# Altium schematic symbol library jlcpcb_2025_04_inductors_extended_0805.schlib: 882 symbols (part 2 of 5) (continued)
## FCI2012F-R12K
designator L?  Inductance: 120nH
Inductor, 120nH, ±10%, 300mΩ, 250mA, SMD 0805; Manufacturer: TAI-TECH; Manufacturer Part Number: FCI2012F-R12K; Package Size: 0805; JLCPCB Basic Part: No; JLCPCB Part Number: C155025; Supplier 1: LCSC; Category: Inductors; Supplier Part Number 1: C155025; Tolerance: ±10%; Rated Current: 250mA; DC Resistance: 300mΩ; RoHS: Yes; ComponentLink1Description: Datasheet; ComponentLink1URL: https://wmsc.lcsc.com/wmsc/upload/file/pdf/v2/lcsc/2009171305_TAI-TECH-FCI2012F-R12K_C155025.pdf; ComponentLink2Description: JLCPCB Part URL; ComponentLink2URL: https://jlcpcb.com/partdetail/C155025; ComponentLink3Description: LCSC Part URL; ComponentLink3URL: https://lcsc.com/product-detail/Inductors-SMD_TAI-TECH-TAI-TECH-FCI2012F-R12K_C155025.html
footprint IND-0805 (0805 (2012M) Inductor)
pins: 1, 2

## FCI2012F-R15K
designator L?  Inductance: 150nH
Inductor, 150nH, ±10%, 400mΩ, 250mA, SMD 0805; Manufacturer: TAI-TECH; Manufacturer Part Number: FCI2012F-R15K; Package Size: 0805; JLCPCB Basic Part: No; JLCPCB Part Number: C155026; Supplier 1: LCSC; Category: Inductors; Supplier Part Number 1: C155026; Tolerance: ±10%; Rated Current: 250mA; DC Resistance: 400mΩ; RoHS: Yes; ComponentLink1Description: Datasheet; ComponentLink1URL: https://wmsc.lcsc.com/wmsc/upload/file/pdf/v2/lcsc/2009171305_TAI-TECH-FCI2012F-R15K_C155026.pdf; ComponentLink2Description: JLCPCB Part URL; ComponentLink2URL: https://jlcpcb.com/partdetail/C155026; ComponentLink3Description: LCSC Part URL; ComponentLink3URL: https://lcsc.com/product-detail/Inductors-SMD_TAI-TECH-TAI-TECH-FCI2012F-R15K_C155026.html
footprint IND-0805 (0805 (2012M) Inductor)
pins: 1, 2

## FCI2012F-R18K
designator L?  Inductance: 180nH
Inductor, 180nH, ±10%, 400mΩ, 250mA, SMD 0805; Manufacturer: TAI-TECH; Manufacturer Part Number: FCI2012F-R18K; Package Size: 0805; JLCPCB Basic Part: No; JLCPCB Part Number: C155027; Supplier 1: LCSC; Category: Inductors; Supplier Part Number 1: C155027; Tolerance: ±10%; Rated Current: 250mA; DC Resistance: 400mΩ; RoHS: Yes; ComponentLink1Description: Datasheet; ComponentLink1URL: https://wmsc.lcsc.com/wmsc/upload/file/pdf/v2/lcsc/2009171305_TAI-TECH-FCI2012F-R18K_C155027.pdf; ComponentLink2Description: JLCPCB Part URL; ComponentLink2URL: https://jlcpcb.com/partdetail/C155027; ComponentLink3Description: LCSC Part URL; ComponentLink3URL: https://lcsc.com/product-detail/Inductors-SMD_TAI-TECH-TAI-TECH-FCI2012F-R18K_C155027.html
footprint IND-0805 (0805 (2012M) Inductor)
pins: 1, 2

## FCI2012F-R22K
designator L?  Inductance: 220nH
Inductor, 220nH, ±10%, 500mΩ, 250mA, SMD 0805; Manufacturer: TAI-TECH; Manufacturer Part Number: FCI2012F-R22K; Package Size: 0805; JLCPCB Basic Part: No; JLCPCB Part Number: C155028; Supplier 1: LCSC; Category: Inductors; Supplier Part Number 1: C155028; Tolerance: ±10%; Rated Current: 250mA; DC Resistance: 500mΩ; RoHS: Yes; ComponentLink1Description: Datasheet; ComponentLink1URL: https://wmsc.lcsc.com/wmsc/upload/file/pdf/v2/lcsc/2009171305_TAI-TECH-FCI2012F-R22K_C155028.pdf; ComponentLink2Description: JLCPCB Part URL; ComponentLink2URL: https://jlcpcb.com/partdetail/C155028; ComponentLink3Description: LCSC Part URL; ComponentLink3URL: https://lcsc.com/product-detail/Inductors-SMD_TAI-TECH-TAI-TECH-FCI2012F-R22K_C155028.html
footprint IND-0805 (0805 (2012M) Inductor)
pins: 1, 2

## FCI2012F-R27K
designator L?  Inductance: 270nH
Inductor, 270nH, ±10%, 500mΩ, 250mA, SMD 0805; Manufacturer: TAI-TECH; Manufacturer Part Number: FCI2012F-R27K; Package Size: 0805; JLCPCB Basic Part: No; JLCPCB Part Number: C155029; Supplier 1: LCSC; Category: Inductors; Supplier Part Number 1: C155029; Tolerance: ±10%; Rated Current: 250mA; DC Resistance: 500mΩ; RoHS: Yes; ComponentLink1Description: Datasheet; ComponentLink1URL: https://wmsc.lcsc.com/wmsc/upload/file/pdf/v2/lcsc/2009171305_TAI-TECH-FCI2012F-R27K_C155029.pdf; ComponentLink2Description: JLCPCB Part URL; ComponentLink2URL: https://jlcpcb.com/partdetail/C155029; ComponentLink3Description: LCSC Part URL; ComponentLink3URL: https://lcsc.com/product-detail/Inductors-SMD_TAI-TECH-TAI-TECH-FCI2012F-R27K_C155029.html
footprint IND-0805 (0805 (2012M) Inductor)
pins: 1, 2

## FCI2012F-R33K
designator L?  Inductance: 330nH
Inductor, 330nH, ±10%, 550mΩ, 250mA, SMD 0805; Manufacturer: TAI-TECH; Manufacturer Part Number: FCI2012F-R33K; Package Size: 0805; JLCPCB Basic Part: No; JLCPCB Part Number: C155030; Supplier 1: LCSC; Category: Inductors; Supplier Part Number 1: C155030; Tolerance: ±10%; Rated Current: 250mA; DC Resistance: 550mΩ; RoHS: Yes; ComponentLink1Description: Datasheet; ComponentLink1URL: https://wmsc.lcsc.com/wmsc/upload/file/pdf/v2/lcsc/2009171305_TAI-TECH-FCI2012F-R33K_C155030.pdf; ComponentLink2Description: JLCPCB Part URL; ComponentLink2URL: https://jlcpcb.com/partdetail/C155030; ComponentLink3Description: LCSC Part URL; ComponentLink3URL: https://lcsc.com/product-detail/Inductors-SMD_TAI-TECH-TAI-TECH-FCI2012F-R33K_C155030.html
footprint IND-0805 (0805 (2012M) Inductor)
pins: 1, 2

## FCI2012F-R39K
designator L?  Inductance: 390nH
Inductor, 390nH, ±10%, 650mΩ, 200mA, SMD 0805; Manufacturer: TAI-TECH; Manufacturer Part Number: FCI2012F-R39K; Package Size: 0805; JLCPCB Basic Part: No; JLCPCB Part Number: C155031; Supplier 1: LCSC; Category: Inductors; Supplier Part Number 1: C155031; Tolerance: ±10%; Rated Current: 200mA; DC Resistance: 650mΩ; RoHS: Yes; ComponentLink1Description: Datasheet; ComponentLink1URL: https://wmsc.lcsc.com/wmsc/upload/file/pdf/v2/lcsc/2009171305_TAI-TECH-FCI2012F-R39K_C155031.pdf; ComponentLink2Description: JLCPCB Part URL; ComponentLink2URL: https://jlcpcb.com/partdetail/C155031; ComponentLink3Description: LCSC Part URL; ComponentLink3URL: https://lcsc.com/product-detail/Inductors-SMD_TAI-TECH-TAI-TECH-FCI2012F-R39K_C155031.html
footprint IND-0805 (0805 (2012M) Inductor)
pins: 1, 2

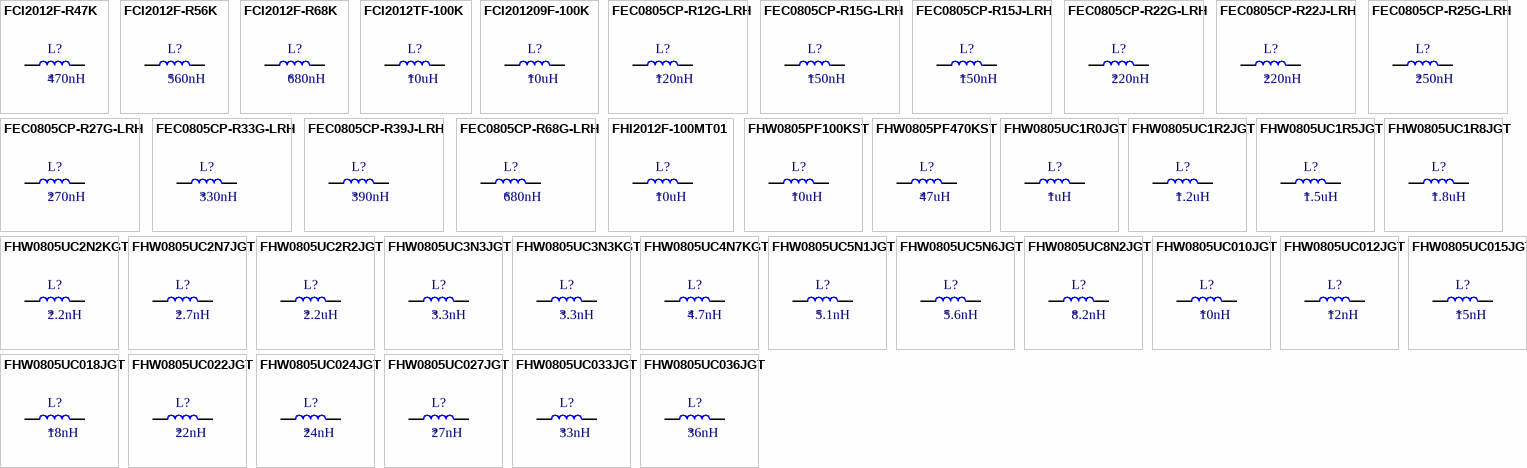
[diagram p6: symbols FCI2012F-R47K to FHW0805UC036JGT]

## FCI2012F-R47K
designator L?  Inductance: 470nH
Inductor, 470nH, ±10%, 650mΩ, 200mA, SMD 0805; Manufacturer: TAI-TECH; Manufacturer Part Number: FCI2012F-R47K; Package Size: 0805; JLCPCB Basic Part: No; JLCPCB Part Number: C155032; Supplier 1: LCSC; Category: Inductors; Supplier Part Number 1: C155032; Tolerance: ±10%; Rated Current: 200mA; DC Resistance: 650mΩ; RoHS: Yes; ComponentLink1Description: Datasheet; ComponentLink1URL: https://wmsc.lcsc.com/wmsc/upload/file/pdf/v2/lcsc/2009171305_TAI-TECH-FCI2012F-R47K_C155032.pdf; ComponentLink2Description: JLCPCB Part URL; ComponentLink2URL: https://jlcpcb.com/partdetail/C155032; ComponentLink3Description: LCSC Part URL; ComponentLink3URL: https://lcsc.com/product-detail/Inductors-SMD_TAI-TECH-TAI-TECH-FCI2012F-R47K_C155032.html
footprint IND-0805 (0805 (2012M) Inductor)
pins: 1, 2

## FCI2012F-R56K
designator L?  Inductance: 560nH
Inductor, 560nH, ±10%, 750mΩ, 150mA, SMD 0805; Manufacturer: TAI-TECH; Manufacturer Part Number: FCI2012F-R56K; Package Size: 0805; JLCPCB Basic Part: No; JLCPCB Part Number: C155033; Supplier 1: LCSC; Category: Inductors; Supplier Part Number 1: C155033; Tolerance: ±10%; Rated Current: 150mA; DC Resistance: 750mΩ; RoHS: Yes; ComponentLink1Description: Datasheet; ComponentLink1URL: https://wmsc.lcsc.com/wmsc/upload/file/pdf/v2/lcsc/2009171305_TAI-TECH-FCI2012F-R56K_C155033.pdf; ComponentLink2Description: JLCPCB Part URL; ComponentLink2URL: https://jlcpcb.com/partdetail/C155033; ComponentLink3Description: LCSC Part URL; ComponentLink3URL: https://lcsc.com/product-detail/Inductors-SMD_TAI-TECH-TAI-TECH-FCI2012F-R56K_C155033.html
footprint IND-0805 (0805 (2012M) Inductor)
pins: 1, 2

## FCI2012F-R68K
designator L?  Inductance: 680nH
Inductor, 680nH, ±10%, 800mΩ, 150mA, SMD 0805; Manufacturer: TAI-TECH; Manufacturer Part Number: FCI2012F-R68K; Package Size: 0805; JLCPCB Basic Part: No; JLCPCB Part Number: C155034; Supplier 1: LCSC; Category: Inductors; Supplier Part Number 1: C155034; Tolerance: ±10%; Rated Current: 150mA; DC Resistance: 800mΩ; RoHS: Yes; ComponentLink1Description: Datasheet; ComponentLink1URL: https://wmsc.lcsc.com/wmsc/upload/file/pdf/v2/lcsc/2009171305_TAI-TECH-FCI2012F-R68K_C155034.pdf; ComponentLink2Description: JLCPCB Part URL; ComponentLink2URL: https://jlcpcb.com/partdetail/C155034; ComponentLink3Description: LCSC Part URL; ComponentLink3URL: https://lcsc.com/product-detail/Inductors-SMD_TAI-TECH-TAI-TECH-FCI2012F-R68K_C155034.html
footprint IND-0805 (0805 (2012M) Inductor)
pins: 1, 2

## FCI2012TF-100K
designator L?  Inductance: 10uH
Inductor, 10uH, ±10%, 1.15Ω, 15mA, SMD 0805; Manufacturer: TAI-TECH; Manufacturer Part Number: FCI2012TF-100K; Package Size: 0805; JLCPCB Basic Part: No; JLCPCB Part Number: C356925; Supplier 1: LCSC; Category: Inductors; Supplier Part Number 1: C356925; Tolerance: ±10%; Rated Current: 15mA; DC Resistance: 1.15Ω; RoHS: Yes; ComponentLink1Description: Datasheet; ComponentLink1URL: https://wmsc.lcsc.com/wmsc/upload/file/pdf/v2/lcsc/2009171137_TAI-TECH-FCI2012TF-100K_C356925.pdf; ComponentLink2Description: JLCPCB Part URL; ComponentLink2URL: https://jlcpcb.com/partdetail/C356925; ComponentLink3Description: LCSC Part URL; ComponentLink3URL: https://lcsc.com/product-detail/Inductors-SMD_TAI-TECH-TAI-TECH-FCI2012TF-100K_C356925.html
footprint IND-0805 (0805 (2012M) Inductor)
pins: 1, 2

## FCI201209F-100K
designator L?  Inductance: 10uH
Inductor, 10uH, ±10%, 1.15Ω, 15mA, SMD 0805; Manufacturer: TAI-TECH; Manufacturer Part Number: FCI201209F-100K; Package Size: 0805; JLCPCB Basic Part: No; JLCPCB Part Number: C304235; Supplier 1: LCSC; Category: Inductors; Supplier Part Number 1: C304235; Tolerance: ±10%; Rated Current: 15mA; DC Resistance: 1.15Ω; RoHS: Yes; ComponentLink1Description: Datasheet; ComponentLink1URL: https://wmsc.lcsc.com/wmsc/upload/file/pdf/v2/lcsc/2009171409_TAI-TECH-FCI201209F-100K_C304235.pdf; ComponentLink2Description: JLCPCB Part URL; ComponentLink2URL: https://jlcpcb.com/partdetail/C304235; ComponentLink3Description: LCSC Part URL; ComponentLink3URL: https://lcsc.com/product-detail/Inductors-SMD_TAI-TECH-TAI-TECH-FCI201209F-100K_C304235.html
footprint IND-0805 (0805 (2012M) Inductor)
pins: 1, 2

## FEC0805CP-R12G-LRH
designator L?  Inductance: 120nH
Inductor, 120nH, ±2%, 510mΩ, 400mA, SMD 0805; Manufacturer: PSA(Prosperity Dielectrics); Manufacturer Part Number: FEC0805CP-R12G-LRH; Package Size: 0805; JLCPCB Basic Part: No; JLCPCB Part Number: C346383; Supplier 1: LCSC; Category: Inductors; Supplier Part Number 1: C346383; Tolerance: ±2%; Rated Current: 400mA; DC Resistance: 510mΩ; RoHS: Yes; ComponentLink1Description: Datasheet; ComponentLink1URL: https://wmsc.lcsc.com/wmsc/upload/file/pdf/v2/lcsc/2304140030_PSA-Prosperity-Dielectrics-FEC0805CP-R12G-LRH_C346383.pdf; ComponentLink2Description: JLCPCB Part URL; ComponentLink2URL: https://jlcpcb.com/partdetail/C346383; ComponentLink3Description: LCSC Part URL; ComponentLink3URL: https://lcsc.com/product-detail/Inductors-SMD_PSAProsperity-Dielectrics-PSAProsperity-Dielectrics-FEC0805CP-R12G-LRH_C346383.html
footprint IND-0805 (0805 (2012M) Inductor)
pins: 1, 2

## FEC0805CP-R15G-LRH
designator L?  Inductance: 150nH
Inductor, 150nH, ±2%, 560mΩ, 400mA, SMD 0805; Manufacturer: PSA(Prosperity Dielectrics); Manufacturer Part Number: FEC0805CP-R15G-LRH; Package Size: 0805; JLCPCB Basic Part: No; JLCPCB Part Number: C346384; Supplier 1: LCSC; Category: Inductors; Supplier Part Number 1: C346384; Tolerance: ±2%; Rated Current: 400mA; DC Resistance: 560mΩ; RoHS: Yes; ComponentLink1Description: Datasheet; ComponentLink1URL: https://wmsc.lcsc.com/wmsc/upload/file/pdf/v2/lcsc/2304140030_PSA-Prosperity-Dielectrics-FEC0805CP-R15G-LRH_C346384.pdf; ComponentLink2Description: JLCPCB Part URL; ComponentLink2URL: https://jlcpcb.com/partdetail/C346384; ComponentLink3Description: LCSC Part URL; ComponentLink3URL: https://lcsc.com/product-detail/Inductors-SMD_PSAProsperity-Dielectrics-PSAProsperity-Dielectrics-FEC0805CP-R15G-LRH_C346384.html
footprint IND-0805 (0805 (2012M) Inductor)
pins: 1, 2

## FEC0805CP-R15J-LRH
designator L?  Inductance: 150nH
Inductor, 150nH, ±5%, 560mΩ, 400mA, SMD 0805; Manufacturer: PSA(Prosperity Dielectrics); Manufacturer Part Number: FEC0805CP-R15J-LRH; Package Size: 0805; JLCPCB Basic Part: No; JLCPCB Part Number: C329441; Supplier 1: LCSC; Category: Inductors; Supplier Part Number 1: C329441; Tolerance: ±5%; Rated Current: 400mA; DC Resistance: 560mΩ; RoHS: Yes; ComponentLink1Description: Datasheet; ComponentLink1URL: https://wmsc.lcsc.com/wmsc/upload/file/pdf/v2/lcsc/2304140030_PSA-Prosperity-Dielectrics-FEC0805CP-R15J-LRH_C329441.pdf; ComponentLink2Description: JLCPCB Part URL; ComponentLink2URL: https://jlcpcb.com/partdetail/C329441; ComponentLink3Description: LCSC Part URL; ComponentLink3URL: https://lcsc.com/product-detail/Inductors-SMD_PSAProsperity-Dielectrics-PSAProsperity-Dielectrics-FEC0805CP-R15J-LRH_C329441.html
footprint IND-0805 (0805 (2012M) Inductor)
pins: 1, 2

## FEC0805CP-R22G-LRH
designator L?  Inductance: 220nH
Inductor, 220nH, ±2%, 700mΩ, 400mA, SMD 0805; Manufacturer: PSA(Prosperity Dielectrics); Manufacturer Part Number: FEC0805CP-R22G-LRH; Package Size: 0805; JLCPCB Basic Part: No; JLCPCB Part Number: C346387; Supplier 1: LCSC; Category: Inductors; Supplier Part Number 1: C346387; Tolerance: ±2%; Rated Current: 400mA; DC Resistance: 700mΩ; RoHS: Yes; ComponentLink1Description: Datasheet; ComponentLink1URL: https://wmsc.lcsc.com/wmsc/upload/file/pdf/v2/lcsc/2304140030_PSA-Prosperity-Dielectrics-FEC0805CP-R22G-LRH_C346387.pdf; ComponentLink2Description: JLCPCB Part URL; ComponentLink2URL: https://jlcpcb.com/partdetail/C346387; ComponentLink3Description: LCSC Part URL; ComponentLink3URL: https://lcsc.com/product-detail/Inductors-SMD_PSAProsperity-Dielectrics-PSAProsperity-Dielectrics-FEC0805CP-R22G-LRH_C346387.html
footprint IND-0805 (0805 (2012M) Inductor)
pins: 1, 2

## FEC0805CP-R22J-LRH
designator L?  Inductance: 220nH
Inductor, 220nH, ±5%, 700mΩ, 400mA, SMD 0805; Manufacturer: PSA(Prosperity Dielectrics); Manufacturer Part Number: FEC0805CP-R22J-LRH; Package Size: 0805; JLCPCB Basic Part: No; JLCPCB Part Number: C329443; Supplier 1: LCSC; Category: Inductors; Supplier Part Number 1: C329443; Tolerance: ±5%; Rated Current: 400mA; DC Resistance: 700mΩ; RoHS: Yes; ComponentLink1Description: Datasheet; ComponentLink1URL: https://wmsc.lcsc.com/wmsc/upload/file/pdf/v2/lcsc/2304140030_PSA-Prosperity-Dielectrics-FEC0805CP-R22J-LRH_C329443.pdf; ComponentLink2Description: JLCPCB Part URL; ComponentLink2URL: https://jlcpcb.com/partdetail/C329443; ComponentLink3Description: LCSC Part URL; ComponentLink3URL: https://lcsc.com/product-detail/Inductors-SMD_PSAProsperity-Dielectrics-PSAProsperity-Dielectrics-FEC0805CP-R22J-LRH_C329443.html
footprint IND-0805 (0805 (2012M) Inductor)
pins: 1, 2

## FEC0805CP-R25G-LRH
designator L?  Inductance: 250nH
Inductor, 250nH, ±2%, 1.2Ω, 350mA, SMD 0805; Manufacturer: PSA(Prosperity Dielectrics); Manufacturer Part Number: FEC0805CP-R25G-LRH; Package Size: 0805; JLCPCB Basic Part: No; JLCPCB Part Number: C346389; Supplier 1: LCSC; Category: Inductors; Supplier Part Number 1: C346389; Tolerance: ±2%; Rated Current: 350mA; DC Resistance: 1.2Ω; RoHS: Yes; ComponentLink1Description: Datasheet; ComponentLink1URL: https://wmsc.lcsc.com/wmsc/upload/file/pdf/v2/lcsc/2304140030_PSA-Prosperity-Dielectrics-FEC0805CP-R25G-LRH_C346389.pdf; ComponentLink2Description: JLCPCB Part URL; ComponentLink2URL: https://jlcpcb.com/partdetail/C346389; ComponentLink3Description: LCSC Part URL; ComponentLink3URL: https://lcsc.com/product-detail/Inductors-SMD_PSAProsperity-Dielectrics-PSAProsperity-Dielectrics-FEC0805CP-R25G-LRH_C346389.html
footprint IND-0805 (0805 (2012M) Inductor)
pins: 1, 2

## FEC0805CP-R27G-LRH
designator L?  Inductance: 270nH
Inductor, 270nH, ±2%, 1Ω, 350mA, SMD 0805; Manufacturer: PSA(Prosperity Dielectrics); Manufacturer Part Number: FEC0805CP-R27G-LRH; Package Size: 0805; JLCPCB Basic Part: No; JLCPCB Part Number: C346390; Supplier 1: LCSC; Category: Inductors; Supplier Part Number 1: C346390; Tolerance: ±2%; Rated Current: 350mA; DC Resistance: 1Ω; RoHS: Yes; ComponentLink1Description: Datasheet; ComponentLink1URL: https://wmsc.lcsc.com/wmsc/upload/file/pdf/v2/lcsc/2304140030_PSA-Prosperity-Dielectrics-FEC0805CP-R27G-LRH_C346390.pdf; ComponentLink2Description: JLCPCB Part URL; ComponentLink2URL: https://jlcpcb.com/partdetail/C346390; ComponentLink3Description: LCSC Part URL; ComponentLink3URL: https://lcsc.com/product-detail/Inductors-SMD_PSAProsperity-Dielectrics-PSAProsperity-Dielectrics-FEC0805CP-R27G-LRH_C346390.html
footprint IND-0805 (0805 (2012M) Inductor)
pins: 1, 2

## FEC0805CP-R33G-LRH
designator L?  Inductance: 330nH
Inductor, 330nH, ±2%, 1.4Ω, 310mA, SMD 0805; Manufacturer: PSA(Prosperity Dielectrics); Manufacturer Part Number: FEC0805CP-R33G-LRH; Package Size: 0805; JLCPCB Basic Part: No; JLCPCB Part Number: C346392; Supplier 1: LCSC; Category: Inductors; Supplier Part Number 1: C346392; Tolerance: ±2%; Rated Current: 310mA; DC Resistance: 1.4Ω; RoHS: Yes; ComponentLink1Description: Datasheet; ComponentLink1URL: https://wmsc.lcsc.com/wmsc/upload/file/pdf/v2/lcsc/2304140030_PSA-Prosperity-Dielectrics-FEC0805CP-R33G-LRH_C346392.pdf; ComponentLink2Description: JLCPCB Part URL; ComponentLink2URL: https://jlcpcb.com/partdetail/C346392; ComponentLink3Description: LCSC Part URL; ComponentLink3URL: https://lcsc.com/product-detail/Inductors-SMD_PSAProsperity-Dielectrics-PSAProsperity-Dielectrics-FEC0805CP-R33G-LRH_C346392.html
footprint IND-0805 (0805 (2012M) Inductor)
pins: 1, 2

## FEC0805CP-R39J-LRH
designator L?  Inductance: 390nH
Inductor, 390nH, ±5%, 1.5Ω, 290mA, SMD 0805; Manufacturer: PSA(Prosperity Dielectrics); Manufacturer Part Number: FEC0805CP-R39J-LRH; Package Size: 0805; JLCPCB Basic Part: No; JLCPCB Part Number: C329444; Supplier 1: LCSC; Category: Inductors; Supplier Part Number 1: C329444; Tolerance: ±5%; Rated Current: 290mA; DC Resistance: 1.5Ω; RoHS: Yes; ComponentLink1Description: Datasheet; ComponentLink1URL: https://wmsc.lcsc.com/wmsc/upload/file/pdf/v2/lcsc/2304140030_PSA-Prosperity-Dielectrics-FEC0805CP-R39J-LRH_C329444.pdf; ComponentLink2Description: JLCPCB Part URL; ComponentLink2URL: https://jlcpcb.com/partdetail/C329444; ComponentLink3Description: LCSC Part URL; ComponentLink3URL: https://lcsc.com/product-detail/Inductors-SMD_PSAProsperity-Dielectrics-PSAProsperity-Dielectrics-FEC0805CP-R39J-LRH_C329444.html
footprint IND-0805 (0805 (2012M) Inductor)
pins: 1, 2

## FEC0805CP-R68G-LRH
designator L?  Inductance: 680nH
Inductor, 680nH, ±2%, 2.2Ω, 190mA, SMD 0805; Manufacturer: PSA(Prosperity Dielectrics); Manufacturer Part Number: FEC0805CP-R68G-LRH; Package Size: 0805; JLCPCB Basic Part: No; JLCPCB Part Number: C346400; Supplier 1: LCSC; Category: Inductors; Supplier Part Number 1: C346400; Tolerance: ±2%; Rated Current: 190mA; DC Resistance: 2.2Ω; RoHS: Yes; ComponentLink1Description: Datasheet; ComponentLink1URL: https://wmsc.lcsc.com/wmsc/upload/file/pdf/v2/lcsc/2005211034_PSA-Prosperity-Dielectrics-FEC0805CP-R68G-LRH_C346400.pdf; ComponentLink2Description: JLCPCB Part URL; ComponentLink2URL: https://jlcpcb.com/partdetail/C346400; ComponentLink3Description: LCSC Part URL; ComponentLink3URL: https://lcsc.com/product-detail/Inductors-SMD_PSAProsperity-Dielectrics-PSAProsperity-Dielectrics-FEC0805CP-R68G-LRH_C346400.html
footprint IND-0805 (0805 (2012M) Inductor)
pins: 1, 2

## FHI2012F-100MT01
designator L?  Inductance: 10uH
Inductor, 10uH, ±20%, 500mΩ, 100mA, SMD 0805; Manufacturer: TAI-TECH; Manufacturer Part Number: FHI2012F-100MT01; Package Size: 0805; JLCPCB Basic Part: No; JLCPCB Part Number: C2909263; Supplier 1: LCSC; Category: Inductors; Supplier Part Number 1: C2909263; Tolerance: ±20%; Rated Current: 100mA; DC Resistance: 500mΩ; RoHS: Yes; ComponentLink1Description: Datasheet; ComponentLink1URL: https://wmsc.lcsc.com/wmsc/upload/file/pdf/v2/lcsc/2110272130_TAI-TECH-FHI2012F-100MT01_C2909263.pdf; ComponentLink2Description: JLCPCB Part URL; ComponentLink2URL: https://jlcpcb.com/partdetail/C2909263; ComponentLink3Description: LCSC Part URL; ComponentLink3URL: https://lcsc.com/product-detail/Inductors-SMD_TAI-TECH-TAI-TECH-FHI2012F-100MT01_C2909263.html
footprint IND-0805 (0805 (2012M) Inductor)
pins: 1, 2

## FHW0805PF100KST
designator L?  Inductance: 10uH
Inductor, 10uH, SMD 0805; Manufacturer: FH (Guangdong Fenghua Advanced Tech); Manufacturer Part Number: FHW0805PF100KST; Package Size: 0805; JLCPCB Basic Part: No; JLCPCB Part Number: C5137250; Supplier 1: LCSC; Category: Inductors; Supplier Part Number 1: C5137250; RoHS: Yes; ComponentLink1Description: Datasheet; ComponentLink1URL: https://wmsc.lcsc.com/wmsc/upload/file/pdf/v2/lcsc/2303141630_FH--Guangdong-Fenghua-Advanced-Tech-FHW0805PF100KST_C5137250.pdf; ComponentLink2Description: JLCPCB Part URL; ComponentLink2URL: https://jlcpcb.com/partdetail/C5137250; ComponentLink3Description: LCSC Part URL; ComponentLink3URL: https://lcsc.com/product-detail/Inductors-SMD_FH-Guangdong-Fenghua-Advanced-Tech-FH-Guangdong-Fenghua-Advanced-Tech-FHW0805PF100KST_C5137250.html
footprint IND-0805 (0805 (2012M) Inductor)
pins: 1, 2

## FHW0805PF470KST
designator L?  Inductance: 47uH
Inductor, 47uH, SMD 0805; Manufacturer: FH (Guangdong Fenghua Advanced Tech); Manufacturer Part Number: FHW0805PF470KST; Package Size: 0805; JLCPCB Basic Part: No; JLCPCB Part Number: C5137252; Supplier 1: LCSC; Category: Inductors; Supplier Part Number 1: C5137252; RoHS: Yes; ComponentLink1Description: Datasheet; ComponentLink1URL: https://wmsc.lcsc.com/wmsc/upload/file/pdf/v2/lcsc/2303141630_FH--Guangdong-Fenghua-Advanced-Tech-FHW0805PF470KST_C5137252.pdf; ComponentLink2Description: JLCPCB Part URL; ComponentLink2URL: https://jlcpcb.com/partdetail/C5137252; ComponentLink3Description: LCSC Part URL; ComponentLink3URL: https://lcsc.com/product-detail/Inductors-SMD_FH-Guangdong-Fenghua-Advanced-Tech-FH-Guangdong-Fenghua-Advanced-Tech-FHW0805PF470KST_C5137252.html
footprint IND-0805 (0805 (2012M) Inductor)
pins: 1, 2

## FHW0805UC1R0JGT
designator L?  Inductance: 1uH
Inductor, 1uH, ±5%, 2.4Ω, 170mA, SMD 0805; Manufacturer: FH(Guangdong Fenghua Advanced Tech); Manufacturer Part Number: FHW0805UC1R0JGT; Self-Resonant Frequency: 200MHz; Q Factor: 20@50MHz; Package Size: 0805; JLCPCB Basic Part: No; JLCPCB Part Number: C108959; Supplier 1: LCSC; Category: Inductors; Supplier Part Number 1: C108959; Tolerance: ±5%; Rated Current: 170mA; DC Resistance: 2.4Ω; RoHS: Yes; ComponentLink1Description: Datasheet; ComponentLink1URL: https://wmsc.lcsc.com/wmsc/upload/file/pdf/v2/lcsc/2302231030_FH--Guangdong-Fenghua-Advanced-Tech-FHW0805UC1R0JGT_C108959.pdf; ComponentLink2Description: JLCPCB Part URL; ComponentLink2URL: https://jlcpcb.com/partdetail/C108959; ComponentLink3Description: LCSC Part URL; ComponentLink3URL: https://lcsc.com/product-detail/Inductors-SMD_FH-Guangdong-Fenghua-Advanced-Tech-FH-Guangdong-Fenghua-Advanced-Tech-FHW0805UC1R0JGT_C108959.html
footprint IND-0805 (0805 (2012M) Inductor)
pins: 1, 2

## FHW0805UC1R2JGT
designator L?  Inductance: 1.2uH
Inductor, 1.2uH, ±5%, 2.55Ω, 170mA, SMD 0805; Manufacturer: FH(Guangdong Fenghua Advanced Tech); Manufacturer Part Number: FHW0805UC1R2JGT; Self-Resonant Frequency: 180MHz; Q Factor: 18@50MHz; Package Size: 0805; JLCPCB Basic Part: No; JLCPCB Part Number: C317996; Supplier 1: LCSC; Category: Inductors; Supplier Part Number 1: C317996; Tolerance: ±5%; Rated Current: 170mA; DC Resistance: 2.55Ω; RoHS: Yes; ComponentLink1Description: Datasheet; ComponentLink1URL: https://wmsc.lcsc.com/wmsc/upload/file/pdf/v2/lcsc/2302231208_FH--Guangdong-Fenghua-Advanced-Tech-FHW0805UC1R2JGT_C317996.pdf; ComponentLink2Description: JLCPCB Part URL; ComponentLink2URL: https://jlcpcb.com/partdetail/C317996; ComponentLink3Description: LCSC Part URL; ComponentLink3URL: https://lcsc.com/product-detail/Inductors-SMD_FH-Guangdong-Fenghua-Advanced-Tech-FH-Guangdong-Fenghua-Advanced-Tech-FHW0805UC1R2JGT_C317996.html
footprint IND-0805 (0805 (2012M) Inductor)
pins: 1, 2

## FHW0805UC1R5JGT
designator L?  Inductance: 1.5uH
Inductor, 1.5uH, ±5%, 2.8Ω, 160mA, SMD 0805; Manufacturer: FH(Guangdong Fenghua Advanced Tech); Manufacturer Part Number: FHW0805UC1R5JGT; Self-Resonant Frequency: 170MHz; Q Factor: 18@50MHz; Package Size: 0805; JLCPCB Basic Part: No; JLCPCB Part Number: C317997; Supplier 1: LCSC; Category: Inductors; Supplier Part Number 1: C317997; Tolerance: ±5%; Rated Current: 160mA; DC Resistance: 2.8Ω; RoHS: Yes; ComponentLink1Description: Datasheet; ComponentLink1URL: https://wmsc.lcsc.com/wmsc/upload/file/pdf/v2/lcsc/2302231208_FH--Guangdong-Fenghua-Advanced-Tech-FHW0805UC1R5JGT_C317997.pdf; ComponentLink2Description: JLCPCB Part URL; ComponentLink2URL: https://jlcpcb.com/partdetail/C317997; ComponentLink3Description: LCSC Part URL; ComponentLink3URL: https://lcsc.com/product-detail/Inductors-SMD_FH-Guangdong-Fenghua-Advanced-Tech-FH-Guangdong-Fenghua-Advanced-Tech-FHW0805UC1R5JGT_C317997.html
footprint IND-0805 (0805 (2012M) Inductor)
pins: 1, 2

## FHW0805UC1R8JGT
designator L?  Inductance: 1.8uH
Inductor, 1.8uH, ±5%, 3.8Ω, 150mA, SMD 0805; Manufacturer: FH(Guangdong Fenghua Advanced Tech); Manufacturer Part Number: FHW0805UC1R8JGT; Self-Resonant Frequency: 140MHz; Q Factor: 18@50MHz; Package Size: 0805; JLCPCB Basic Part: No; JLCPCB Part Number: C317998; Supplier 1: LCSC; Category: Inductors; Supplier Part Number 1: C317998; Tolerance: ±5%; Rated Current: 150mA; DC Resistance: 3.8Ω; RoHS: Yes; ComponentLink1Description: Datasheet; ComponentLink1URL: https://wmsc.lcsc.com/wmsc/upload/file/pdf/v2/lcsc/2302231208_FH--Guangdong-Fenghua-Advanced-Tech-FHW0805UC1R8JGT_C317998.pdf; ComponentLink2Description: JLCPCB Part URL; ComponentLink2URL: https://jlcpcb.com/partdetail/C317998; ComponentLink3Description: LCSC Part URL; ComponentLink3URL: https://lcsc.com/product-detail/Inductors-SMD_FH-Guangdong-Fenghua-Advanced-Tech-FH-Guangdong-Fenghua-Advanced-Tech-FHW0805UC1R8JGT_C317998.html
footprint IND-0805 (0805 (2012M) Inductor)
pins: 1, 2

## FHW0805UC2N2KGT
designator L?  Inductance: 2.2nH
Inductor, 2.2nH, ±10%, 30mΩ, 800mA, SMD 0805; Manufacturer: FH(Guangdong Fenghua Advanced Tech); Manufacturer Part Number: FHW0805UC2N2KGT; Self-Resonant Frequency: 8.5GHz; Q Factor: 50@1.5GHz; Package Size: 0805; JLCPCB Basic Part: No; JLCPCB Part Number: C317991; Supplier 1: LCSC; Category: Inductors; Supplier Part Number 1: C317991; Tolerance: ±10%; Rated Current: 800mA; DC Resistance: 30mΩ; RoHS: Yes; ComponentLink1Description: Datasheet; ComponentLink1URL: https://wmsc.lcsc.com/wmsc/upload/file/pdf/v2/lcsc/2302231208_FH--Guangdong-Fenghua-Advanced-Tech-FHW0805UC2N2KGT_C317991.pdf; ComponentLink2Description: JLCPCB Part URL; ComponentLink2URL: https://jlcpcb.com/partdetail/C317991; ComponentLink3Description: LCSC Part URL; ComponentLink3URL: https://lcsc.com/product-detail/Inductors-SMD_FH-Guangdong-Fenghua-Advanced-Tech-FH-Guangdong-Fenghua-Advanced-Tech-FHW0805UC2N2KGT_C317991.html
footprint IND-0805 (0805 (2012M) Inductor)
pins: 1, 2

## FHW0805UC2N7JGT
designator L?  Inductance: 2.7nH
Inductor, 2.7nH, ±5%, 45mΩ, 800mA, SMD 0805; Manufacturer: FH(Guangdong Fenghua Advanced Tech); Manufacturer Part Number: FHW0805UC2N7JGT; Self-Resonant Frequency: 8GHz; Q Factor: 50@1.5GHz; Package Size: 0805; JLCPCB Basic Part: No; JLCPCB Part Number: C317992; Supplier 1: LCSC; Category: Inductors; Supplier Part Number 1: C317992; Tolerance: ±5%; Rated Current: 800mA; DC Resistance: 45mΩ; RoHS: Yes; ComponentLink1Description: Datasheet; ComponentLink1URL: https://wmsc.lcsc.com/wmsc/upload/file/pdf/v2/lcsc/2302231208_FH--Guangdong-Fenghua-Advanced-Tech-FHW0805UC2N7JGT_C317992.pdf; ComponentLink2Description: JLCPCB Part URL; ComponentLink2URL: https://jlcpcb.com/partdetail/C317992; ComponentLink3Description: LCSC Part URL; ComponentLink3URL: https://lcsc.com/product-detail/Inductors-SMD_FH-Guangdong-Fenghua-Advanced-Tech-FH-Guangdong-Fenghua-Advanced-Tech-FHW0805UC2N7JGT_C317992.html
footprint IND-0805 (0805 (2012M) Inductor)
pins: 1, 2

## FHW0805UC2R2JGT
designator L?  Inductance: 2.2uH
Inductor, 2.2uH, ±5%, 4.2Ω, 150mA, SMD 0805; Manufacturer: FH(Guangdong Fenghua Advanced Tech); Manufacturer Part Number: FHW0805UC2R2JGT; Self-Resonant Frequency: 50MHz; Q Factor: 16@7.9MHz; Package Size: 0805; JLCPCB Basic Part: No; JLCPCB Part Number: C139259; Supplier 1: LCSC; Category: Inductors; Supplier Part Number 1: C139259; Tolerance: ±5%; Rated Current: 150mA; DC Resistance: 4.2Ω; RoHS: Yes; ComponentLink1Description: Datasheet; ComponentLink1URL: https://wmsc.lcsc.com/wmsc/upload/file/pdf/v2/lcsc/2302231230_FH--Guangdong-Fenghua-Advanced-Tech-FHW0805UC2R2JGT_C139259.pdf; ComponentLink2Description: JLCPCB Part URL; ComponentLink2URL: https://jlcpcb.com/partdetail/C139259; ComponentLink3Description: LCSC Part URL; ComponentLink3URL: https://lcsc.com/product-detail/Inductors-SMD_FH-Guangdong-Fenghua-Advanced-Tech-FH-Guangdong-Fenghua-Advanced-Tech-FHW0805UC2R2JGT_C139259.html
footprint IND-0805 (0805 (2012M) Inductor)
pins: 1, 2

## FHW0805UC3N3JGT
designator L?  Inductance: 3.3nH
Inductor, 3.3nH, ±5%, 90mΩ, 600mA, SMD 0805; Manufacturer: FH(Guangdong Fenghua Advanced Tech); Manufacturer Part Number: FHW0805UC3N3JGT; Package Size: 0805; JLCPCB Basic Part: No; JLCPCB Part Number: C401479; Supplier 1: LCSC; Category: Inductors; Supplier Part Number 1: C401479; Tolerance: ±5%; Rated Current: 600mA; DC Resistance: 90mΩ; RoHS: Yes; ComponentLink1Description: Datasheet; ComponentLink1URL: https://wmsc.lcsc.com/wmsc/upload/file/pdf/v2/lcsc/2302231130_FH--Guangdong-Fenghua-Advanced-Tech-FHW0805UC3N3JGT_C401479.pdf; ComponentLink2Description: JLCPCB Part URL; ComponentLink2URL: https://jlcpcb.com/partdetail/C401479; ComponentLink3Description: LCSC Part URL; ComponentLink3URL: https://lcsc.com/product-detail/Inductors-SMD_FH-Guangdong-Fenghua-Advanced-Tech-FH-Guangdong-Fenghua-Advanced-Tech-FHW0805UC3N3JGT_C401479.html
footprint IND-0805 (0805 (2012M) Inductor)
pins: 1, 2

## FHW0805UC3N3KGT
designator L?  Inductance: 3.3nH
Inductor, 3.3nH, ±10%, 90mΩ, 600mA, SMD 0805; Manufacturer: FH(Guangdong Fenghua Advanced Tech); Manufacturer Part Number: FHW0805UC3N3KGT; Self-Resonant Frequency: 7.9GHz; Q Factor: 35@1.5GHz; Package Size: 0805; JLCPCB Basic Part: No; JLCPCB Part Number: C295704; Supplier 1: LCSC; Category: Inductors; Supplier Part Number 1: C295704; Tolerance: ±10%; Rated Current: 600mA; DC Resistance: 90mΩ; RoHS: Yes; ComponentLink1Description: Datasheet; ComponentLink1URL: https://wmsc.lcsc.com/wmsc/upload/file/pdf/v2/lcsc/2302231208_FH--Guangdong-Fenghua-Advanced-Tech-FHW0805UC3N3KGT_C295704.pdf; ComponentLink2Description: JLCPCB Part URL; ComponentLink2URL: https://jlcpcb.com/partdetail/C295704; ComponentLink3Description: LCSC Part URL; ComponentLink3URL: https://lcsc.com/product-detail/Inductors-SMD_FH-Guangdong-Fenghua-Advanced-Tech-FH-Guangdong-Fenghua-Advanced-Tech-FHW0805UC3N3KGT_C295704.html
footprint IND-0805 (0805 (2012M) Inductor)
pins: 1, 2

## FHW0805UC4N7KGT
designator L?  Inductance: 4.7nH
Inductor, 4.7nH, ±10%, 50mΩ, 600mA, SMD 0805; Manufacturer: FH(Guangdong Fenghua Advanced Tech); Manufacturer Part Number: FHW0805UC4N7KGT; Self-Resonant Frequency: 6GHz; Q Factor: 40@1GHz; Package Size: 0805; JLCPCB Basic Part: No; JLCPCB Part Number: C317993; Supplier 1: LCSC; Category: Inductors; Supplier Part Number 1: C317993; Tolerance: ±10%; Rated Current: 600mA; DC Resistance: 50mΩ; RoHS: Yes; ComponentLink1Description: Datasheet; ComponentLink1URL: https://wmsc.lcsc.com/wmsc/upload/file/pdf/v2/lcsc/2302231208_FH--Guangdong-Fenghua-Advanced-Tech-FHW0805UC4N7KGT_C317993.pdf; ComponentLink2Description: JLCPCB Part URL; ComponentLink2URL: https://jlcpcb.com/partdetail/C317993; ComponentLink3Description: LCSC Part URL; ComponentLink3URL: https://lcsc.com/product-detail/Inductors-SMD_FH-Guangdong-Fenghua-Advanced-Tech-FH-Guangdong-Fenghua-Advanced-Tech-FHW0805UC4N7KGT_C317993.html
footprint IND-0805 (0805 (2012M) Inductor)
pins: 1, 2

## FHW0805UC5N1JGT
designator L?  Inductance: 5.1nH
Inductor, 5.1nH, ±5%, SMD 0805; Manufacturer: FH(Guangdong Fenghua Advanced Tech); Manufacturer Part Number: FHW0805UC5N1JGT; Package Size: 0805; JLCPCB Basic Part: No; JLCPCB Part Number: C395041; Supplier 1: LCSC; Category: Inductors; Supplier Part Number 1: C395041; Tolerance: ±5%; RoHS: Yes; ComponentLink1Description: Datasheet; ComponentLink1URL: https://wmsc.lcsc.com/wmsc/upload/file/pdf/v2/lcsc/2302231208_FH--Guangdong-Fenghua-Advanced-Tech-FHW0805UC5N1JGT_C395041.pdf; ComponentLink2Description: JLCPCB Part URL; ComponentLink2URL: https://jlcpcb.com/partdetail/C395041; ComponentLink3Description: LCSC Part URL; ComponentLink3URL: https://lcsc.com/product-detail/Inductors-SMD_FH-Guangdong-Fenghua-Advanced-Tech-FH-Guangdong-Fenghua-Advanced-Tech-FHW0805UC5N1JGT_C395041.html
footprint IND-0805 (0805 (2012M) Inductor)
pins: 1, 2

## FHW0805UC5N6JGT
designator L?  Inductance: 5.6nH
Inductor, 5.6nH, ±5%, 65mΩ, 600mA, SMD 0805; Manufacturer: FH(Guangdong Fenghua Advanced Tech); Manufacturer Part Number: FHW0805UC5N6JGT; Self-Resonant Frequency: 5.5GHz; Q Factor: 50@1GHz; Package Size: 0805; JLCPCB Basic Part: No; JLCPCB Part Number: C114490; Supplier 1: LCSC; Category: Inductors; Supplier Part Number 1: C114490; Tolerance: ±5%; Rated Current: 600mA; DC Resistance: 65mΩ; RoHS: Yes; ComponentLink1Description: Datasheet; ComponentLink1URL: https://wmsc.lcsc.com/wmsc/upload/file/pdf/v2/lcsc/2302231030_FH--Guangdong-Fenghua-Advanced-Tech-FHW0805UC5N6JGT_C114490.pdf; ComponentLink2Description: JLCPCB Part URL; ComponentLink2URL: https://jlcpcb.com/partdetail/C114490; ComponentLink3Description: LCSC Part URL; ComponentLink3URL: https://lcsc.com/product-detail/Inductors-SMD_FH-Guangdong-Fenghua-Advanced-Tech-FH-Guangdong-Fenghua-Advanced-Tech-FHW0805UC5N6JGT_C114490.html
footprint IND-0805 (0805 (2012M) Inductor)
pins: 1, 2

## FHW0805UC8N2JGT
designator L?  Inductance: 8.2nH
Inductor, 8.2nH, ±5%, 200mΩ, 600mA, SMD 0805; Manufacturer: FH(Guangdong Fenghua Advanced Tech); Manufacturer Part Number: FHW0805UC8N2JGT; Self-Resonant Frequency: 4.7GHz; Q Factor: 35@1GHz; Package Size: 0805; JLCPCB Basic Part: No; JLCPCB Part Number: C112232; Supplier 1: LCSC; Category: Inductors; Supplier Part Number 1: C112232; Tolerance: ±5%; Rated Current: 600mA; DC Resistance: 200mΩ; RoHS: Yes; ComponentLink1Description: Datasheet; ComponentLink1URL: https://wmsc.lcsc.com/wmsc/upload/file/pdf/v2/lcsc/2302231030_FH--Guangdong-Fenghua-Advanced-Tech-FHW0805UC8N2JGT_C112232.pdf; ComponentLink2Description: JLCPCB Part URL; ComponentLink2URL: https://jlcpcb.com/partdetail/C112232; ComponentLink3Description: LCSC Part URL; ComponentLink3URL: https://lcsc.com/product-detail/Inductors-SMD_FH-Guangdong-Fenghua-Advanced-Tech-FH-Guangdong-Fenghua-Advanced-Tech-FHW0805UC8N2JGT_C112232.html
footprint IND-0805 (0805 (2012M) Inductor)
pins: 1, 2

## FHW0805UC010JGT
designator L?  Inductance: 10nH
Inductor, 10nH, ±5%, 150mΩ, 600mA, SMD 0805; Manufacturer: FH(Guangdong Fenghua Advanced Tech); Manufacturer Part Number: FHW0805UC010JGT; Self-Resonant Frequency: 4.2GHz; Q Factor: 50@500MHz; Package Size: 0805; JLCPCB Basic Part: No; JLCPCB Part Number: C108074; Supplier 1: LCSC; Category: Inductors; Supplier Part Number 1: C108074; Tolerance: ±5%; Rated Current: 600mA; DC Resistance: 150mΩ; RoHS: Yes; ComponentLink1Description: Datasheet; ComponentLink1URL: https://wmsc.lcsc.com/wmsc/upload/file/pdf/v2/lcsc/2302231030_FH--Guangdong-Fenghua-Advanced-Tech-FHW0805UC010JGT_C108074.pdf; ComponentLink2Description: JLCPCB Part URL; ComponentLink2URL: https://jlcpcb.com/partdetail/C108074; ComponentLink3Description: LCSC Part URL; ComponentLink3URL: https://lcsc.com/product-detail/Inductors-SMD_FH-Guangdong-Fenghua-Advanced-Tech-FH-Guangdong-Fenghua-Advanced-Tech-FHW0805UC010JGT_C108074.html
footprint IND-0805 (0805 (2012M) Inductor)
pins: 1, 2

## FHW0805UC012JGT
designator L?  Inductance: 12nH
Inductor, 12nH, ±5%, 150mΩ, 600mA, SMD 0805; Manufacturer: FH(Guangdong Fenghua Advanced Tech); Manufacturer Part Number: FHW0805UC012JGT; Self-Resonant Frequency: 4GHz; Q Factor: 50@500MHz; Package Size: 0805; JLCPCB Basic Part: No; JLCPCB Part Number: C304274; Supplier 1: LCSC; Category: Inductors; Supplier Part Number 1: C304274; Tolerance: ±5%; Rated Current: 600mA; DC Resistance: 150mΩ; RoHS: Yes; ComponentLink1Description: Datasheet; ComponentLink1URL: https://wmsc.lcsc.com/wmsc/upload/file/pdf/v2/lcsc/2302231030_FH--Guangdong-Fenghua-Advanced-Tech-FHW0805UC012JGT_C304274.pdf; ComponentLink2Description: JLCPCB Part URL; ComponentLink2URL: https://jlcpcb.com/partdetail/C304274; ComponentLink3Description: LCSC Part URL; ComponentLink3URL: https://lcsc.com/product-detail/Inductors-SMD_FH-Guangdong-Fenghua-Advanced-Tech-FH-Guangdong-Fenghua-Advanced-Tech-FHW0805UC012JGT_C304274.html
footprint IND-0805 (0805 (2012M) Inductor)
pins: 1, 2

## FHW0805UC015JGT
designator L?  Inductance: 15nH
Inductor, 15nH, ±5%, 170mΩ, 600mA, SMD 0805; Manufacturer: FH(Guangdong Fenghua Advanced Tech); Manufacturer Part Number: FHW0805UC015JGT; Self-Resonant Frequency: 3.4GHz; Q Factor: 45@500MHz; Package Size: 0805; JLCPCB Basic Part: No; JLCPCB Part Number: C108963; Supplier 1: LCSC; Category: Inductors; Supplier Part Number 1: C108963; Tolerance: ±5%; Rated Current: 600mA; DC Resistance: 170mΩ; RoHS: Yes; ComponentLink1Description: Datasheet; ComponentLink1URL: https://wmsc.lcsc.com/wmsc/upload/file/pdf/v2/lcsc/2302231030_FH--Guangdong-Fenghua-Advanced-Tech-FHW0805UC015JGT_C108963.pdf; ComponentLink2Description: JLCPCB Part URL; ComponentLink2URL: https://jlcpcb.com/partdetail/C108963; ComponentLink3Description: LCSC Part URL; ComponentLink3URL: https://lcsc.com/product-detail/Inductors-SMD_FH-Guangdong-Fenghua-Advanced-Tech-FH-Guangdong-Fenghua-Advanced-Tech-FHW0805UC015JGT_C108963.html
footprint IND-0805 (0805 (2012M) Inductor)
pins: 1, 2

## FHW0805UC018JGT
designator L?  Inductance: 18nH
Inductor, 18nH, ±5%, 200mΩ, 600mA, SMD 0805; Manufacturer: FH(Guangdong Fenghua Advanced Tech); Manufacturer Part Number: FHW0805UC018JGT; Self-Resonant Frequency: 3.3GHz; Q Factor: 55@500MHz; Package Size: 0805; JLCPCB Basic Part: No; JLCPCB Part Number: C317994; Supplier 1: LCSC; Category: Inductors; Supplier Part Number 1: C317994; Tolerance: ±5%; Rated Current: 600mA; DC Resistance: 200mΩ; RoHS: Yes; ComponentLink1Description: Datasheet; ComponentLink1URL: https://wmsc.lcsc.com/wmsc/upload/file/pdf/v2/lcsc/2302231208_FH--Guangdong-Fenghua-Advanced-Tech-FHW0805UC018JGT_C317994.pdf; ComponentLink2Description: JLCPCB Part URL; ComponentLink2URL: https://jlcpcb.com/partdetail/C317994; ComponentLink3Description: LCSC Part URL; ComponentLink3URL: https://lcsc.com/product-detail/Inductors-SMD_FH-Guangdong-Fenghua-Advanced-Tech-FH-Guangdong-Fenghua-Advanced-Tech-FHW0805UC018JGT_C317994.html
footprint IND-0805 (0805 (2012M) Inductor)
pins: 1, 2

## FHW0805UC022JGT
designator L?  Inductance: 22nH
Inductor, 22nH, ±5%, 220mΩ, 500mA, SMD 0805; Manufacturer: FH(Guangdong Fenghua Advanced Tech); Manufacturer Part Number: FHW0805UC022JGT; Self-Resonant Frequency: 2.6GHz; Q Factor: 55@500MHz; Package Size: 0805; JLCPCB Basic Part: No; JLCPCB Part Number: C108962; Supplier 1: LCSC; Category: Inductors; Supplier Part Number 1: C108962; Tolerance: ±5%; Rated Current: 500mA; DC Resistance: 220mΩ; RoHS: Yes; ComponentLink1Description: Datasheet; ComponentLink1URL: https://wmsc.lcsc.com/wmsc/upload/file/pdf/v2/lcsc/2302231030_FH--Guangdong-Fenghua-Advanced-Tech-FHW0805UC022JGT_C108962.pdf; ComponentLink2Description: JLCPCB Part URL; ComponentLink2URL: https://jlcpcb.com/partdetail/C108962; ComponentLink3Description: LCSC Part URL; ComponentLink3URL: https://lcsc.com/product-detail/Inductors-SMD_FH-Guangdong-Fenghua-Advanced-Tech-FH-Guangdong-Fenghua-Advanced-Tech-FHW0805UC022JGT_C108962.html
footprint IND-0805 (0805 (2012M) Inductor)
pins: 1, 2

## FHW0805UC024JGT
designator L?  Inductance: 24nH
Inductor, 24nH, ±5%, SMD 0805; Manufacturer: FH(Guangdong Fenghua Advanced Tech); Manufacturer Part Number: FHW0805UC024JGT; Package Size: 0805; JLCPCB Basic Part: No; JLCPCB Part Number: C295703; Supplier 1: LCSC; Category: Inductors; Supplier Part Number 1: C295703; Tolerance: ±5%; RoHS: Yes; ComponentLink1Description: Datasheet; ComponentLink1URL: https://wmsc.lcsc.com/wmsc/upload/file/pdf/v2/lcsc/2302231208_FH--Guangdong-Fenghua-Advanced-Tech-FHW0805UC024JGT_C295703.pdf; ComponentLink2Description: JLCPCB Part URL; ComponentLink2URL: https://jlcpcb.com/partdetail/C295703; ComponentLink3Description: LCSC Part URL; ComponentLink3URL: https://lcsc.com/product-detail/Inductors-SMD_FH-Guangdong-Fenghua-Advanced-Tech-FH-Guangdong-Fenghua-Advanced-Tech-FHW0805UC024JGT_C295703.html
footprint IND-0805 (0805 (2012M) Inductor)
pins: 1, 2

## FHW0805UC027JGT
designator L?  Inductance: 27nH
Inductor, 27nH, ±5%, 250mΩ, 500mA, SMD 0805; Manufacturer: FH(Guangdong Fenghua Advanced Tech); Manufacturer Part Number: FHW0805UC027JGT; Self-Resonant Frequency: 2.5GHz; Q Factor: 55@500MHz; Package Size: 0805; JLCPCB Basic Part: No; JLCPCB Part Number: C139258; Supplier 1: LCSC; Category: Inductors; Supplier Part Number 1: C139258; Tolerance: ±5%; Rated Current: 500mA; DC Resistance: 250mΩ; RoHS: Yes; ComponentLink1Description: Datasheet; ComponentLink1URL: https://wmsc.lcsc.com/wmsc/upload/file/pdf/v2/lcsc/2302231230_FH--Guangdong-Fenghua-Advanced-Tech-FHW0805UC027JGT_C139258.pdf; ComponentLink2Description: JLCPCB Part URL; ComponentLink2URL: https://jlcpcb.com/partdetail/C139258; ComponentLink3Description: LCSC Part URL; ComponentLink3URL: https://lcsc.com/product-detail/Inductors-SMD_FH-Guangdong-Fenghua-Advanced-Tech-FH-Guangdong-Fenghua-Advanced-Tech-FHW0805UC027JGT_C139258.html
footprint IND-0805 (0805 (2012M) Inductor)
pins: 1, 2

## FHW0805UC033JGT
designator L?  Inductance: 33nH
Inductor, 33nH, ±5%, 270mΩ, 500mA, SMD 0805; Manufacturer: FH(Guangdong Fenghua Advanced Tech); Manufacturer Part Number: FHW0805UC033JGT; Self-Resonant Frequency: 2.05GHz; Q Factor: 55@500MHz; Package Size: 0805; JLCPCB Basic Part: No; JLCPCB Part Number: C113328; Supplier 1: LCSC; Category: Inductors; Supplier Part Number 1: C113328; Tolerance: ±5%; Rated Current: 500mA; DC Resistance: 270mΩ; RoHS: Yes; ComponentLink1Description: Datasheet; ComponentLink1URL: https://wmsc.lcsc.com/wmsc/upload/file/pdf/v2/lcsc/2302231030_FH--Guangdong-Fenghua-Advanced-Tech-FHW0805UC033JGT_C113328.pdf; ComponentLink2Description: JLCPCB Part URL; ComponentLink2URL: https://jlcpcb.com/partdetail/C113328; ComponentLink3Description: LCSC Part URL; ComponentLink3URL: https://lcsc.com/product-detail/Inductors-SMD_FH-Guangdong-Fenghua-Advanced-Tech-FH-Guangdong-Fenghua-Advanced-Tech-FHW0805UC033JGT_C113328.html
footprint IND-0805 (0805 (2012M) Inductor)
pins: 1, 2

## FHW0805UC036JGT
designator L?  Inductance: 36nH
Inductor, 36nH, ±5%, SMD 0805; Manufacturer: FH(Guangdong Fenghua Advanced Tech); Manufacturer Part Number: FHW0805UC036JGT; Package Size: 0805; JLCPCB Basic Part: No; JLCPCB Part Number: C395039; Supplier 1: LCSC; Category: Inductors; Supplier Part Number 1: C395039; Tolerance: ±5%; RoHS: Yes; ComponentLink1Description: Datasheet; ComponentLink1URL: https://wmsc.lcsc.com/wmsc/upload/file/pdf/v2/lcsc/2302231208_FH--Guangdong-Fenghua-Advanced-Tech-FHW0805UC036JGT_C395039.pdf; ComponentLink2Description: JLCPCB Part URL; ComponentLink2URL: https://jlcpcb.com/partdetail/C395039; ComponentLink3Description: LCSC Part URL; ComponentLink3URL: https://lcsc.com/product-detail/Inductors-SMD_FH-Guangdong-Fenghua-Advanced-Tech-FH-Guangdong-Fenghua-Advanced-Tech-FHW0805UC036JGT_C395039.html
footprint IND-0805 (0805 (2012M) Inductor)
pins: 1, 2
